# Altium footprint library ConnectMedical.PcbLib: 76 footprints (part 5 of 5)
Each footprint in its own frame and in the unit in brackets; x right, y up, seen from the top. Pads: shape width x height; smd on the part's side, far side on the other; paste and mask are expansions set on the pad; w line width, h text height; cw(c..) or ccw(c..) is an arc to the next point about the centre after c.
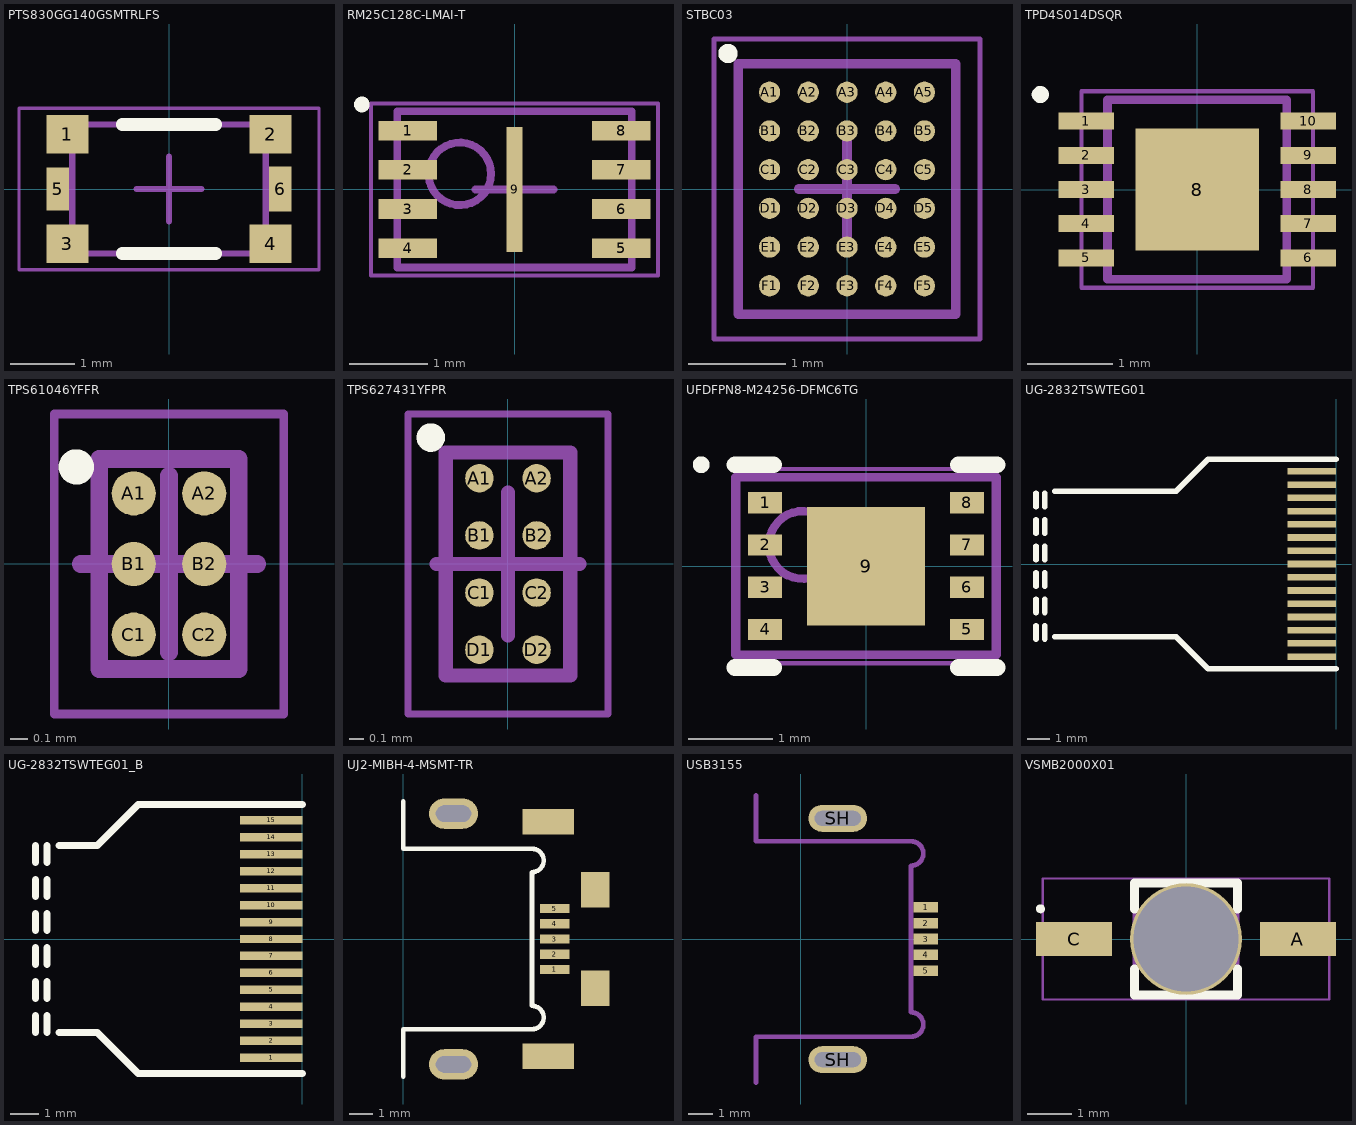
[diagram p4: the footprints below, top view; thin cyan lines are the x and y axes]

## PTS830GG140GSMTRLFS [mm] "SWITCH TACTILE SPST-NO 0.05A 12V"
height 0.6
pads (6):
  rect 0.65x0.6 smd mask+0.05: 1(-1.575,0.85) 2(1.575,0.85) 3(-1.575,-0.85) 4(1.575,-0.85)
  rect 0.35x0.67 smd mask+0.05: 5(-1.725,0)
  rect 0.35x0.7 smd mask+0.05: 6(1.725,0)
Top Overlay:
  lines w0.2: -0.725,-1 0.725,-1 ; -0.725,1 0.725,1
Mechanical 13:
  lines w0.1: -1.5,-1 1.5,-1 1.5,1 -1.5,1 -1.5,-1
Mechanical 15:
  lines w0.05: -2.325,-1.25 2.325,-1.25 2.325,1.25 -2.325,1.25 -2.325,-1.25
  lines w0.1: -0.5,0 0.5,0 ; 0,-0.5 0,0.5
3D body "PTS830GG140GSMTRLFS1 v1.step": height 1.4, standoff 0, extent -1.75,-1.3 1.75,1.3

## RM25C128C-LMAI-T [mm] "IC EEPROM 128KBIT 10MHZ 8DFN"
height 0.6
pads (9):
  rect 0.75x0.25 smd: 1(-1.365,0.75) 2(-1.365,0.25) 3(-1.365,-0.25) 4(-1.365,-0.75) 5(1.365,-0.75) 6(1.365,-0.25) 7(1.365,0.25) 8(1.365,0.75)
  rect 0.2x1.6 smd: 9(0,0)
Top Overlay:
  circle w0.1: c-1.952,1.087 r0.05
Mechanical 13:
  circle w0.1: c-0.7,0.2 r0.4
  lines w0.1: -1.5,-1 1.5,-1 1.5,1 -1.5,1 -1.5,-1
Mechanical 15:
  lines w0.05: -1.835,-1.1 1.835,-1.1 1.835,1.1 -1.835,1.1 -1.835,-1.1
  lines w0.1: -0.5,0 0.5,0 ; 0,-0.5 0,0.5
3D body "RM25C128C-LMAI-T.step": height 0.6, standoff 0, extent -1.55,-1 1.55,1

## STBC03 [mm] "Li-Ion linear battery charger with LDO and load switches"
height 0.6
pads (30):
  round 0.22 smd paste-0.01 mask+0.045: A1(-0.8,1) A3(0,1) A4(0.4,1) A5(0.8,1) B1(-0.8,0.6) B5(0.8,0.6) C1(-0.8,0.2) C3(0,0.2) C5(0.8,0.2) D1(-0.8,-0.2) D3(0,-0.2) D5(0.8,-0.2) E1(-0.8,-0.6) E5(0.8,-0.6) F1(-0.8,-1) F2(-0.4,-1) F3(0,-1) F4(0.4,-1) F5(0.8,-1)
  round 0.22 smd paste-0.05 mask+0.045: A2(-0.4,1) B2(-0.4,0.6) B3(0,0.6) B4(0.4,0.6) C2(-0.4,0.2) C4(0.4,0.2) D2(-0.4,-0.2) D4(0.4,-0.2) E2(-0.4,-0.6) E3(0,-0.6) E4(0.4,-0.6)
Top Overlay:
  circle w0.1: c-1.23,1.4 r0.05
Mechanical 13:
  lines w0.1: -1.125,-1.295 1.125,-1.295 1.125,1.295 -1.125,1.295 -1.125,-1.295
Mechanical 15:
  lines w0.05: -1.375,-1.55 1.375,-1.55 1.375,1.55 -1.375,1.55 -1.375,-1.55
  lines w0.1: -0.5,0 0.5,0 ; 0,-0.5 0,0.5
3D body "STBC03_2.step": height 0.6, standoff 0, extent -1.125,-1.295 1.125,1.295

## TPD4S014DSQR [mm] "IC USB PORT PROTECTION 10SON"
height 0.8
pads (11):
  rect 0.65x0.2 smd mask+0.07: 1(-1.3,0.8) 2(-1.3,0.4) 3(-1.3,0) 4(-1.3,-0.4) 5(-1.3,-0.8) 6(1.3,-0.8) 7(1.3,-0.4) 8(1.3,0) 9(1.3,0.4) 10(1.3,0.8)
  rect 1.45x1.43 smd mask+0.07: 8(0,0)
Top Overlay:
  circle w0.1: c-1.837,1.112 r0.05
Mechanical 13:
  circle w0.1: c-0.25,0.25 r0.4
  lines w0.1: -1.05,-1.05 1.05,-1.05 1.05,1.05 -1.05,1.05 -1.05,-1.05
Mechanical 15:
  lines w0.05: -1.355,-1.15 1.355,-1.15 1.355,1.15 -1.355,1.15 -1.355,-1.15
  lines w0.1: -0.5,0 0.5,0 ; 0,-0.5 0,0.5
3D body "TPD4S014DSQR.step": height 0.8, standoff 0, extent -1.1,-1.05 1.1,1.05

## TPS61046YFFR [mm] "IC LED DRVR RGLTR DIM"
height 0.63
pads (6):
  round 0.25 smd mask+0.045: A1(-0.2,0.4) A2(0.2,0.4) B1(-0.2,0) B2(0.2,0) C1(-0.2,-0.4) C2(0.2,-0.4)
Top Overlay:
  circle w0.1: c-0.525,0.55 r0.05
Mechanical 13:
  lines w0.1: -0.395,-0.595 0.395,-0.595 0.395,0.595 -0.395,0.595 -0.395,-0.595
Mechanical 15:
  lines w0.05: -0.65,-0.85 0.65,-0.85 0.65,0.85 -0.65,0.85 -0.65,-0.85
  lines w0.1: -0.5,0 0.5,0 ; 0,-0.5 0,0.5
3D body "TPS61046YFFR.step": height 0.63, standoff 0, extent -0.395,-0.595 0.395,0.595

## TPS627431YFPR [mm] "IC REG BCK PROG 0.4A SYNC 8DSBGA"
height 0.5
pads (8):
  round 0.2 smd mask+0.07: A1(-0.2,0.6) A2(0.2,0.6) B1(-0.2,0.2) B2(0.2,0.2) C1(-0.2,-0.2) C2(0.2,-0.2) D1(-0.2,-0.6) D2(0.2,-0.6)
Top Overlay:
  circle w0.1: c-0.54,0.885 r0.05
Mechanical 13:
  lines w0.1: -0.435,-0.78 0.435,-0.78 0.435,0.78 -0.435,0.78 -0.435,-0.78
Mechanical 15:
  lines w0.05: -0.7,-1.05 0.7,-1.05 0.7,1.05 -0.7,1.05 -0.7,-1.05
  lines w0.1: -0.5,0 0.5,0 ; 0,-0.5 0,0.5
3D body "TPS627431YFPR.step": height 0.5, standoff 0, extent -0.435,-0.78 0.435,0.78

## UFDFPN8-M24256-DFMC6TG [mm] "PSON, 8-Leads, Body 2.00x3.00mm, Pitch 0.50mm, Thermal Pad 1.40x1.40mm, IPC High Density"
height 0.45
pads (9):
  rect 0.4x0.25 smd mask+0.08: 1(-1.195,0.75) 2(-1.195,0.25) 3(-1.195,-0.25) 4(-1.195,-0.75) 5(1.195,-0.75) 6(1.195,-0.25) 7(1.195,0.25) 8(1.195,0.75)
  rect 1.4x1.4 smd paste-0.7 mask+0.08: 9(0,0)
Top Overlay:
  circle w0.1: c-1.95,1.2 r0.05
  lines w0.2: -1.55,-1.2 -1.095,-1.2 ; -1.55,1.2 -1.095,1.2 ; 1.095,-1.2 1.55,-1.2 ; 1.095,1.2 1.55,1.2
Top Paste:
  rectangle: 0.1,-0.7 0.7,-0.1
  rectangle: 0.1,0.1 0.7,0.7
  rectangle: -0.7,-0.7 -0.1,-0.1
  rectangle: -0.7,0.1 -0.1,0.7
Mechanical 13:
  circle w0.1: c-0.75,0.25 r0.4
  lines w0.1: -1.55,-1.05 1.55,-1.05 1.55,1.05 -1.55,1.05 -1.55,-1.05
Mechanical 15:
  lines w0.05: -1.51,-1.15 1.51,-1.15 1.51,1.15 -1.51,1.15 -1.51,-1.15
  lines w0.1: -0.5,0 0.5,0 ; 0,-0.5 0,0.5
3D body "UFDFPN8-M24256-DFMC6TG.step": height 0.45, standoff 0, extent -1.551,-1.05 1.551,1.05

## UG-2832TSWTEG01 [mm] "OLED Display"
pads (15):
  rect 2.2x0.3 smd: 1(-1.1,-4.2) 2(-1.1,-3.6) 3(-1.1,-3) 4(-1.1,-2.4) 5(-1.1,-1.8) 6(-1.1,-1.2) 7(-1.1,-0.6) 8(-1.1,0) 9(-1.1,0.6) 10(-1.1,1.2) 11(-1.1,1.8) 12(-1.1,2.4) 13(-1.1,3) 14(-1.1,3.6) 15(-1.1,4.2)
Top Overlay:
  lines w0.254: -13.6,-3.4 -13.6,-2.8 ; -13.6,-2.2 -13.6,-1.6 ; -13.6,-1 -13.6,-0.4 ; -13.6,0.2 -13.6,0.8 ; -13.6,1.4 -13.6,2 ; -13.6,2.6 -13.6,3.2 ; -13.2,-3.4 -13.2,-2.8 ; -13.2,-2.2 -13.2,-1.6 ; -13.2,-1 -13.2,-0.4 ; -13.2,0.2 -13.2,0.8 ; -13.2,1.4 -13.2,2 ; -13.2,2.6 -13.2,3.2 ; -12.75,-3.3 -7.25,-3.3 -5.8,-4.75 0,-4.75 ; -12.75,3.3 -7.25,3.3 -5.8,4.75 0,4.75

## UG-2832TSWTEG01_B [mm] "OLED Display"
pads (15):
  rect 2.2x0.3 smd: 1(-1.1,-4.2) 2(-1.1,-3.6) 3(-1.1,-3) 4(-1.1,-2.4) 5(-1.1,-1.8) 6(-1.1,-1.2) 7(-1.1,-0.6) 8(-1.1,0) 9(-1.1,0.6) 10(-1.1,1.2) 11(-1.1,1.8) 12(-1.1,2.4) 13(-1.1,3) 14(-1.1,3.6) 15(-1.1,4.2)
Top Overlay:
  lines w0.254: -9.425,-3.3 -9.425,-2.7 ; -9.425,-2.1 -9.425,-1.5 ; -9.425,-0.9 -9.425,-0.3 ; -9.425,0.3 -9.425,0.9 ; -9.425,1.5 -9.425,2.1 ; -9.425,2.7 -9.425,3.3 ; -9.025,-3.3 -9.025,-2.7 ; -9.025,-2.1 -9.025,-1.5 ; -9.025,-0.9 -9.025,-0.3 ; -9.025,0.3 -9.025,0.9 ; -9.025,1.5 -9.025,2.1 ; -9.025,2.7 -9.025,3.3 ; -8.6,-3.3 -7.25,-3.3 -5.8,-4.75 0,-4.75 ; -8.6,3.3 -7.25,3.3 -5.8,4.75 0,4.75

## UJ2-MIBH-4-MSMT-TR [mm] "USB Connector"
pads (11):
  rect 1.25x0.4 smd: 1(6.475,-1.3) 2(6.475,-0.65) 3(6.475,0) 4(6.475,0.65) 5(6.475,1.3)
  oval 2.1x1.3 hole 0.7 slot 1.5 at 0 deg: ""(2.15,-5.35) ""(2.15,5.35)
  rect 2.2x1.1 smd: ""(6.2,-5) ""(6.2,5)
  rect 1.2x1.5 smd: ""(8.2,-2.1) ""(8.2,2.1)
Top Overlay:
  lines w0.2: 0,-5.875 0,-3.85 5.5,-3.85 ccw(c5.5,-3.35) 5.5,-2.85 5.5,2.85 ccw(c5.5,3.35) 5.5,3.85 0,3.85 0,5.875
3D body "UJ2-MIBH-4-MSMT_AP203.stp": height 0.9, standoff -1.81, extent 0.025,-5.5 8.725,5.5

## USB3155 [mm] "USB Connector"
pads (7):
  rect 1x0.43 smd mask+0.07: 1(5.125,1.3) 2(5.125,0.65) 3(5.125,0) 4(5.125,-0.65) 5(5.125,-1.3)
  oval 2.4x1.1 hole 0.6 slot 1.9 at 0 deg: SH(1.52,-4.94) SH(1.52,4.94)
Mechanical 15:
  lines w0.2: -1.83,-5.875 -1.83,-4 4.52,-4 ccw(c4.52,-3.5) 4.52,-3 4.52,3 ccw(c4.52,3.5) 4.52,4 -1.83,4 -1.83,5.875
3D body "USB3155-30-A_revB v1.step": height 0.31, standoff -2.5, extent -1.143,-5.09 5.275,5.09

## VSMB2000X01 [mm] "High Speed Infrared Emitting Diodes, 2-Leads, Body 2.30x5.80mm, IPC High Density"
height 2.97
pads (3):
  rect 1.7x0.75 smd: A(2.5,0) C(-2.5,0)
  round 2.5 hole 2.35: ""(0,0)
Top Overlay:
  circle w0.1: c-3.25,0.675 r0.05
  lines w0.2: -1.15,-0.675 -1.15,-1.25 1.15,-1.25 1.15,-0.675 ; -1.15,0.675 -1.15,1.25 1.15,1.25 1.15,0.675
Mechanical 13:
  lines w0.1: -1.15,-1.25 1.15,-1.25 1.15,1.25 -1.15,1.25 -1.15,-1.25
Mechanical 15:
  lines w0.05: -3.2,-1.35 3.2,-1.35 3.2,1.35 -3.2,1.35 -3.2,-1.35
  lines w0.1: -0.5,0 0.5,0 ; 0,-0.5 0,0.5